# Altium footprint library B-NT_CONNECT.PcbLib: 109 footprints (part 4 of 7)
Each footprint in its own frame and in the unit in brackets; x right, y up, seen from the top. Pads: shape width x height; smd on the part's side, far side on the other; paste and mask are expansions set on the pad; w line width, h text height; cw(c..) or ccw(c..) is an arc to the next point about the centre after c.
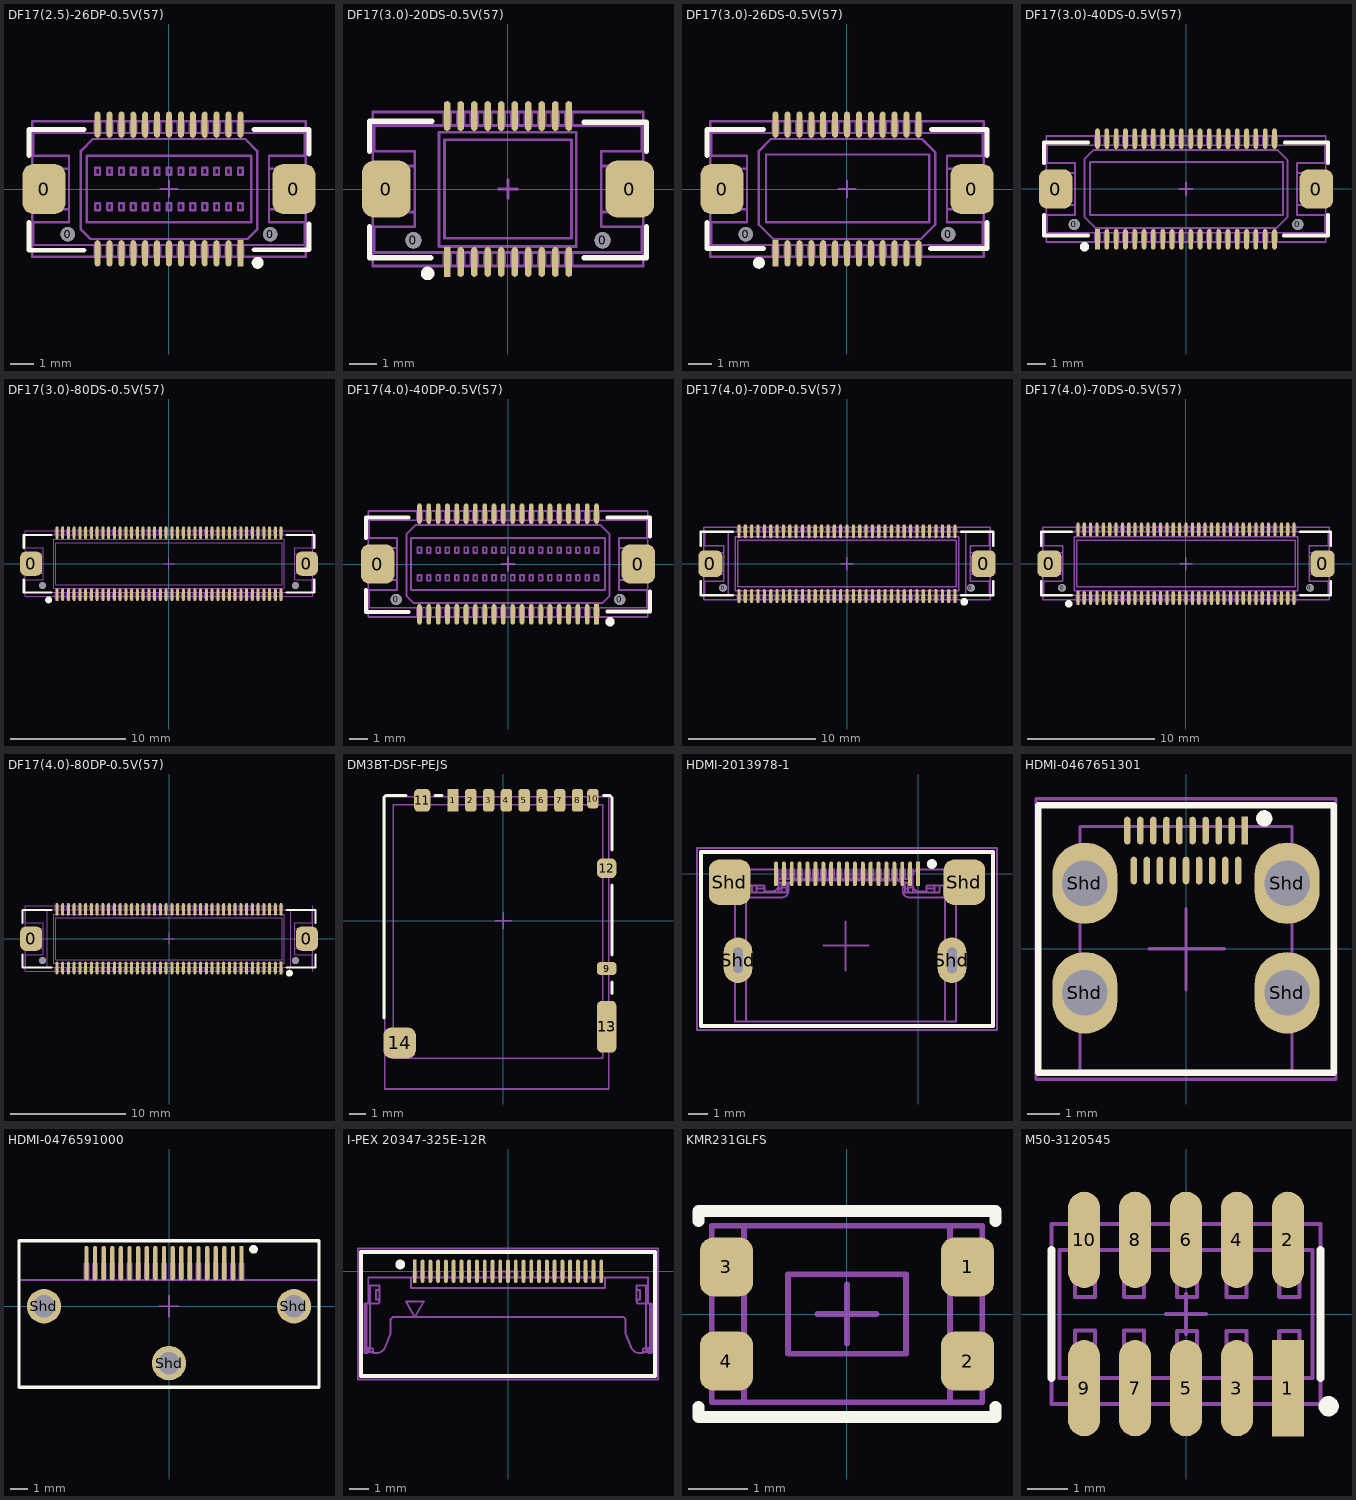
[diagram p3: the footprints below, top view; thin cyan lines are the x and y axes]

## DF17(2.5)-26DP-0.5V(57) [mm] "CONN HDR 26POS .5MM SMD W/FIT"
height 4.8
pads (30):
  rrect50% 1.8x2.1 smd: 0(-5.25,0) 0(5.25,0)
  round 0.6 hole 0.6: 0(-4.25,-1.9) 0(4.25,-1.9)
  rect 0.25x1.1 smd: 1(3,-2.7)
  oval 0.25x1.1 smd: 2(3,2.7) 3(2.5,-2.7) 4(2.5,2.7) 5(2,-2.7) 6(2,2.7) 7(1.5,-2.7) 8(1.5,2.7) 9(1,-2.7) 10(1,2.7) 11(0.5,-2.7) 12(0.5,2.7) 13(0,-2.7) 14(0,2.7) 15(-0.5,-2.7) 16(-0.5,2.7) 17(-1,-2.7) 18(-1,2.7) 19(-1.5,-2.7) 20(-1.5,2.7) 21(-2,-2.7) 22(-2,2.7) 23(-2.5,-2.7) 24(-2.5,2.7) 25(-3,-2.7) 26(-3,2.7)
Top Overlay:
  circle w0.3: c3.725,-3.1 r0.1
  lines w0.2: -5.875,-1.4 -5.875,-2.575 -3.575,-2.575 ; -5.875,1.4 -5.875,2.5 -3.575,2.5 ; 3.575,-2.55 5.875,-2.55 5.875,-1.475 ; 3.575,2.5 5.875,2.5 5.875,1.475
M3 Top Assy:
  drawing of 217 lines, arcs and shapes, not listed
M8 Top Brd Anno:
  lines w0.1: -0.35,0 0.35,0 ; 0,-0.325 0,0.35 ; -5.75,-2.85 -5.75,2.85 5.75,2.85 5.75,-2.85 -5.75,-2.85
3D body "DF17(2_5)-26DP-0_5V.stp": height 4.74, standoff -0.66, extent -5.75,-2.85 5.75,2.85

## DF17(3.0)-20DS-0.5V(57) [mm] "CONN RECEPT 20POS .5MM SMD W/FIT"
height 3.5
pads (24):
  rrect50% 1.8x2.1 smd: 0(-4.5,0) 0(4.5,0)
  round 0.6 hole 0.6: 0(-3.5,-1.9) 0(3.5,-1.9)
  rect 0.25x1.1 smd: 1(-2.25,-2.7)
  oval 0.25x1.1 smd: 2(-2.25,2.7) 3(-1.75,-2.7) 4(-1.75,2.7) 5(-1.25,-2.7) 6(-1.25,2.7) 7(-0.75,-2.7) 8(-0.75,2.7) 9(-0.25,-2.7) 10(-0.25,2.7) 11(0.25,-2.7) 12(0.25,2.7) 13(0.75,-2.7) 14(0.75,2.7) 15(1.25,-2.7) 16(1.25,2.7) 17(1.75,-2.7) 18(1.75,2.7) 19(2.25,-2.7) 20(2.25,2.7)
Top Overlay:
  circle w0.3: c-2.975,-3.125 r0.1
  lines w0.2: -5.125,-1.4 -5.125,-2.55 -2.85,-2.55 ; -5.125,1.4 -5.125,2.5 -2.825,2.5 ; 2.825,-2.55 5.125,-2.55 5.125,-1.4 ; 2.825,2.475 5.125,2.475 5.125,1.4
M3 Top Assy:
  lines w0.1: -3.45,-0.85 -4.95,-0.85 -4.95,0.85 -3.45,0.85 -3.45,0 ; -2.375,-2.35 -2.375,-2.85 -2.125,-2.85 -2.125,-2.35 ; -2.375,2.35 -2.375,2.85 -2.125,2.85 -2.125,2.35 ; -1.875,-2.35 -1.875,-2.85 -1.625,-2.85 -1.625,-2.35 ; -1.875,2.35 -1.875,2.85 -1.625,2.85 -1.625,2.35 ; -1.375,-2.35 -1.375,-2.85 -1.125,-2.85 -1.125,-2.35 ; -1.375,2.35 -1.375,2.85 -1.125,2.85 -1.125,2.35 ; -0.875,-2.35 -0.875,-2.85 -0.625,-2.85 -0.625,-2.35 ; -0.875,2.35 -0.875,2.85 -0.625,2.85 -0.625,2.35 ; -0.375,-2.35 -0.375,-2.85 -0.125,-2.85 -0.125,-2.35 ; -0.35,2.35 -0.35,2.85 -0.125,2.85 -0.125,2.35 ; 0.125,-2.35 0.125,-2.85 0.375,-2.85 0.375,-2.35 ; 0.125,2.35 0.125,2.85 0.375,2.85 0.375,2.35 ; 0.625,-2.35 0.625,-2.85 0.875,-2.85 0.875,-2.35 ; 0.625,2.35 0.625,2.85 0.875,2.85 0.875,2.35 ; 1.125,-2.35 1.125,-2.85 1.375,-2.85 1.375,-2.35 ; 1.125,2.35 1.125,2.85 1.375,2.85 1.375,2.35 ; 1.625,-2.35 1.625,-2.85 1.875,-2.85 1.875,-2.35 ; 1.625,2.35 1.625,2.85 1.875,2.85 1.875,2.35 ; 2.125,-2.35 2.125,-2.85 2.375,-2.85 2.375,-2.35 ; 2.125,2.35 2.125,2.85 ; 2.375,2.35 2.375,2.85 ; 3.45,-0.85 4.95,-0.85 4.95,0.85 3.45,0.85 ; -3.45,0 -3.45,1.4 -4.95,1.4 -4.95,2.35 4.95,2.35 ; -3.45,0 -3.45,-1.4 -4.95,-1.4 -4.95,-2.35 4.95,-2.35 4.95,-1.4 3.45,-1.4 3.45,0 3.45,1.4 4.95,1.4 4.95,2.35 ; 2.125,2.85 2.375,2.85 ; 2.125,2.85 2.375,2.85 ; 4.95,2.35 4.95,2.35 ; -2.55,-2.125 -2.55,2.1 2.525,2.1 2.525,-2.125 -2.55,-2.125 ; -2.35,-1.825 2.35,-1.825 2.35,1.825 -2.35,1.825 -2.35,-1.825
M8 Top Brd Anno:
  lines w0.1: -0.35,0 0.35,0 ; 0,-0.35 0,0.35 ; -5,-2.85 5,-2.85 5,2.85 -5,2.85 -5,-2.85
3D body "DF17(3_0)-20DS-0_5V.stp": height 3.5, standoff -0.6, extent -5,-2.85 5,2.85

## DF17(3.0)-26DS-0.5V(57) [mm] "CONN RECEPT 26POS .5MM SMD W/FIT"
height 3.5
pads (30):
  rrect50% 1.8x2.1 smd: 0(-5.25,0) 0(5.25,0)
  round 0.6 hole 0.6: 0(-4.25,-1.9) 0(4.25,-1.9)
  rect 0.25x1.1 smd: 1(-3,-2.7)
  oval 0.25x1.1 smd: 2(-3,2.7) 3(-2.5,-2.7) 4(-2.5,2.7) 5(-2,-2.7) 6(-2,2.7) 7(-1.5,-2.7) 8(-1.5,2.7) 9(-1,-2.7) 10(-1,2.7) 11(-0.5,-2.7) 12(-0.5,2.7) 13(0,-2.7) 14(0,2.7) 15(0.5,-2.7) 16(0.5,2.7) 17(1,-2.7) 18(1,2.7) 19(1.5,-2.7) 20(1.5,2.7) 21(2,-2.7) 22(2,2.7) 23(2.5,-2.7) 24(2.5,2.7) 25(3,-2.7) 26(3,2.7)
Top Overlay:
  circle w0.3: c-3.7,-3.1 r0.1
  lines w0.2: -5.875,-1.4 -5.875,-2.5 -3.5,-2.5 ; -5.875,1.4 -5.875,2.5 -3.5,2.5 ; 3.5,-2.5 5.875,-2.5 5.875,-1.4 ; 3.55,2.5 5.875,2.5 5.875,1.4
M3 Top Assy:
  lines w0.1: -4.2,-0.85 -5.7,-0.85 -5.7,0.85 -4.2,0.85 -4.2,0 ; -3.125,-2.35 -3.125,-2.85 -2.875,-2.85 -2.875,-2.35 ; -3.125,2.35 -3.125,2.85 -2.875,2.85 -2.875,2.35 ; -2.625,-2.35 -2.625,-2.85 -2.375,-2.85 -2.375,-2.35 ; -2.625,2.35 -2.625,2.85 -2.375,2.85 -2.375,2.35 ; -2.125,-2.35 -2.125,-2.85 -1.875,-2.85 -1.875,-2.35 ; -2.125,2.35 -2.125,2.85 -1.875,2.85 -1.875,2.35 ; -1.625,-2.35 -1.625,-2.85 -1.375,-2.85 -1.375,-2.35 ; -1.625,2.35 -1.625,2.85 -1.375,2.85 -1.375,2.35 ; -1.125,-2.35 -1.125,-2.85 -0.875,-2.85 -0.875,-2.35 ; -1.1,2.35 -1.1,2.85 -0.875,2.85 -0.875,2.35 ; -0.625,-2.35 -0.625,-2.85 -0.375,-2.85 -0.375,-2.35 ; -0.625,2.35 -0.625,2.85 -0.375,2.85 -0.375,2.35 ; -0.125,-2.35 -0.125,-2.85 0.125,-2.85 0.125,-2.35 ; -0.125,2.35 -0.125,2.85 0.125,2.85 0.125,2.35 ; 0.375,-2.35 0.375,-2.85 0.625,-2.85 0.625,-2.35 ; 0.375,2.35 0.375,2.85 0.625,2.85 0.625,2.35 ; 0.875,-2.35 0.875,-2.85 1.125,-2.85 1.125,-2.35 ; 0.875,2.35 0.875,2.85 1.125,2.85 1.125,2.35 ; 1.375,-2.35 1.375,-2.85 1.625,-2.85 1.625,-2.35 ; 1.375,2.35 1.375,2.85 ; 1.625,2.35 1.625,2.85 ; 1.875,-2.35 1.875,-2.85 2.125,-2.85 2.125,-2.35 ; 1.875,2.375 1.875,2.875 2.125,2.875 2.125,2.375 ; 2.375,-2.35 2.375,-2.85 2.625,-2.85 2.625,-2.35 ; 2.375,2.35 2.375,2.85 2.625,2.85 2.625,2.35 ; 2.875,-2.35 2.875,-2.85 3.125,-2.85 3.125,-2.35 ; 2.875,2.35 2.875,2.85 3.125,2.85 3.125,2.35 ; 4.2,-0.85 5.7,-0.85 5.7,0.85 4.2,0.85 ; -4.2,0 -4.2,-1.4 -5.7,-1.4 -5.7,-2.35 5.7,-2.35 5.7,-1.4 4.2,-1.4 4.2,0 4.2,1.4 5.7,1.4 5.7,2.35 -5.7,2.35 -5.7,1.4 -4.2,1.4 -4.2,0 ; 1.375,2.85 1.625,2.85 ; 1.375,2.85 1.625,2.85 ; -3.7,-1.5 -3.7,1.6 -3.2,2.1 3.15,2.1 3.7,1.55 3.7,-1.5 3.1,-2.1 -3.1,-2.1 -3.7,-1.5 ; -3.4,-1.4 -3.4,0.913 -3.4,1.45 3.45,1.45 3.45,-1.4 -3.4,-1.4
M8 Top Brd Anno:
  lines w0.1: -0.35,0 0.35,0 ; 0,-0.35 0,0.35 ; -5.75,-2.85 5.75,-2.85 5.75,2.85 -5.75,2.85 -5.75,-2.85
3D body "DF17(3_0)-26DS-0_5V.stp": height 3.42, standoff -0.68, extent -5.75,-2.85 5.75,2.85

## DF17(3.0)-40DS-0.5V(57) [mm]
pads (44):
  rrect50% 1.8x2.1 smd: 0(-7,0) 0(7,0)
  round 0.6 hole 0.6: 0(-6,-1.9) 0(6,-1.9)
  rect 0.25x1.1 smd: 1(-4.75,-2.7)
  oval 0.25x1.1 smd: 2(-4.75,2.7) 3(-4.25,-2.7) 4(-4.25,2.7) 5(-3.75,-2.7) 6(-3.75,2.7) 7(-3.25,-2.7) 8(-3.25,2.7) 9(-2.75,-2.7) 10(-2.75,2.7) 11(-2.25,-2.7) 12(-2.25,2.7) 13(-1.75,-2.7) 14(-1.75,2.7) 15(-1.25,-2.7) 16(-1.25,2.7) 17(-0.75,-2.7) 18(-0.75,2.7) 19(-0.25,-2.7) 20(-0.25,2.7) 21(0.25,-2.7) 22(0.25,2.7) 23(0.75,-2.7) 24(0.75,2.7) 25(1.25,-2.7) 26(1.25,2.7) 27(1.75,-2.7) 28(1.75,2.7) 29(2.25,-2.7) 30(2.25,2.7) 31(2.75,-2.7) 32(2.75,2.7) 33(3.25,-2.7) 34(3.25,2.7) 35(3.75,-2.7) 36(3.75,2.7) 37(4.25,-2.7) 38(4.25,2.7) 39(4.75,-2.7) 40(4.75,2.7)
Top Overlay:
  circle w0.3: c-5.45,-3.1 r0.1
  lines w0.2: -7.625,-1.4 -7.625,-2.5 -5.25,-2.5 ; -7.625,1.4 -7.625,2.5 -5.25,2.5 ; 5.25,-2.5 7.625,-2.5 7.625,-1.4 ; 5.3,2.5 7.625,2.5 7.625,1.4
M3 Top Assy:
  drawing of 157 lines, arcs and shapes, not listed
M8 Top Brd Anno:
  lines w0.1: -0.35,0 0.35,0 ; 0,-0.35 0,0.35 ; -7.5,-2.85 7.5,-2.85 7.5,2.85 -7.5,2.85 -7.5,-2.85
3D body "DF17(3_0)-40DS-0_5V.stp": height 3.42, standoff -0.68, extent -7.5,-2.85 7.5,2.85

## DF17(3.0)-80DS-0.5V(57) [mm]
pads (84):
  rrect50% 1.9x2.1 smd: 0(-12,0) 0(12,0)
  round 0.6 hole 0.6: 0(-11,-1.9) 0(11,-1.9)
  rect 0.25x1.1 smd: 1(-9.75,-2.7)
  oval 0.25x1.1 smd: 2(-9.75,2.7) 3(-9.25,-2.7) 4(-9.25,2.7) 5(-8.75,-2.7) 6(-8.75,2.7) 7(-8.25,-2.7) 8(-8.25,2.7) 9(-7.75,-2.7) 10(-7.75,2.7) 11(-7.25,-2.7) 12(-7.25,2.7) 13(-6.75,-2.7) 14(-6.75,2.7) 15(-6.25,-2.7) 16(-6.25,2.7) 17(-5.75,-2.7) 18(-5.75,2.7) 19(-5.25,-2.7) 20(-5.25,2.7) 21(-4.75,-2.7) 22(-4.75,2.7) 23(-4.25,-2.7) 24(-4.25,2.7) 25(-3.75,-2.7) 26(-3.75,2.7) 27(-3.25,-2.7) 28(-3.25,2.7) 29(-2.75,-2.7) 30(-2.75,2.7) 31(-2.25,-2.7) 32(-2.25,2.7) 33(-1.75,-2.7) 34(-1.75,2.7) 35(-1.25,-2.7) 36(-1.25,2.7) 37(-0.75,-2.7) 38(-0.75,2.7) 39(-0.25,-2.7) 40(-0.25,2.7) 41(0.25,-2.7) 42(0.25,2.7) 43(0.75,-2.7) 44(0.75,2.7) 45(1.25,-2.7) 46(1.25,2.7) 47(1.75,-2.7) 48(1.75,2.7) 49(2.25,-2.7) 50(2.25,2.7) 51(2.75,-2.7) 52(2.75,2.7) 53(3.25,-2.7) 54(3.25,2.7) 55(3.75,-2.7) 56(3.75,2.7) 57(4.25,-2.7) 58(4.25,2.7) 59(4.75,-2.7) 60(4.75,2.7) 61(5.25,-2.7) 62(5.25,2.7) 63(5.75,-2.7) 64(5.75,2.7) 65(6.25,-2.7) 66(6.25,2.7) 67(6.75,-2.7) 68(6.75,2.7) 69(7.25,-2.7) 70(7.25,2.7) 71(7.75,-2.7) 72(7.75,2.7) 73(8.25,-2.7) 74(8.25,2.7) 75(8.75,-2.7) 76(8.75,2.7) 77(9.25,-2.7) 78(9.25,2.7) 79(9.75,-2.7) 80(9.75,2.7)
Top Overlay:
  circle w0.3: c-10.475,-3.15 r0.15
  lines w0.2: -12.625,-1.4 -12.625,-2.5 -10.25,-2.5 ; -12.625,1.4 -12.625,2.5 -10.25,2.5 ; 10.25,-2.5 12.625,-2.5 12.625,-1.4 ; 10.25,2.5 12.625,2.5 12.625,1.4
M3 Top Assy:
  drawing of 269 lines, arcs and shapes, not listed
M8 Top Brd Anno:
  lines w0.1: -0.5,0 0.5,0 ; 0,-0.5 0,0.5 ; -12.5,-2.85 12.5,-2.85 12.5,2.85 -12.5,2.85 -12.5,-2.85
3D body "DF17(3_0)-80DS-0_5V.stp": height 3.5, standoff -0.6, extent -12.5,-2.85 12.5,2.85

## DF17(4.0)-40DP-0.5V(57) [mm]
pads (44):
  rrect50% 1.8x2.1 smd: 0(-7,0) 0(7,0)
  round 0.6 hole 0.6: 0(-6,-1.9) 0(6,-1.9)
  rect 0.25x1.1 smd: 1(4.75,-2.7)
  oval 0.25x1.1 smd: 2(4.75,2.7) 3(4.25,-2.7) 4(4.25,2.7) 5(3.75,-2.7) 6(3.75,2.7) 7(3.25,-2.7) 8(3.25,2.7) 9(2.75,-2.7) 10(2.75,2.7) 11(2.25,-2.7) 12(2.25,2.7) 13(1.75,-2.7) 14(1.75,2.7) 15(1.25,-2.7) 16(1.25,2.7) 17(0.75,-2.7) 18(0.75,2.7) 19(0.25,-2.7) 20(0.25,2.7) 21(-0.25,-2.7) 22(-0.25,2.7) 23(-0.75,-2.7) 24(-0.75,2.7) 25(-1.25,-2.7) 26(-1.25,2.7) 27(-1.75,-2.7) 28(-1.75,2.7) 29(-2.25,-2.7) 30(-2.25,2.7) 31(-2.75,-2.7) 32(-2.75,2.7) 33(-3.25,-2.7) 34(-3.25,2.7) 35(-3.75,-2.7) 36(-3.75,2.7) 37(-4.25,-2.7) 38(-4.25,2.7) 39(-4.75,-2.7) 40(-4.75,2.7)
Top Overlay:
  circle w0.3: c5.475,-3.1 r0.1
  lines w0.2: -7.625,-1.4 -7.625,-2.575 -5.325,-2.575 ; -7.625,1.4 -7.625,2.5 -5.325,2.5 ; 5.325,-2.55 7.625,-2.55 7.625,-1.475 ; 5.325,2.5 7.625,2.5 7.625,1.475
M3 Top Assy:
  drawing of 316 lines, arcs and shapes, not listed
M8 Top Brd Anno:
  lines w0.1: -0.35,0 0.35,0 ; 0,-0.35 0,0.35 ; -7.5,-2.85 7.5,-2.85 7.5,2.85 -7.5,2.85 -7.5,-2.85
3D body "DF17(4_0)-40DP-0_5V.stp": height 6.24, standoff -0.66, extent -7.5,-2.85 7.5,2.85

## DF17(4.0)-70DP-0.5V(57) [mm]
pads (74):
  rrect50% 1.9x2.1 smd: 0(-10.75,0) 0(10.75,0)
  round 0.6 hole 0.6: 0(-9.75,-1.9) 0(9.75,-1.9)
  rect 0.25x1.1 smd: 1(8.5,-2.55)
  oval 0.25x1.1 smd: 2(8.5,2.55) 3(8,-2.55) 4(8,2.55) 5(7.5,-2.55) 6(7.5,2.55) 7(7,-2.55) 8(7,2.55) 9(6.5,-2.55) 10(6.5,2.55) 11(6,-2.55) 12(6,2.55) 13(5.5,-2.55) 14(5.5,2.55) 15(5,-2.55) 16(5,2.55) 17(4.5,-2.55) 18(4.5,2.55) 19(4,-2.55) 20(4,2.55) 21(3.5,-2.55) 22(3.5,2.55) 23(3,-2.55) 24(3,2.55) 25(2.5,-2.55) 26(2.5,2.55) 27(2,-2.55) 28(2,2.55) 29(1.5,-2.55) 30(1.5,2.55) 31(1,-2.55) 32(1,2.55) 33(0.5,-2.55) 34(0.5,2.55) 35(0,-2.55) 36(0,2.55) 37(-0.5,-2.55) 38(-0.5,2.55) 39(-1,-2.55) 40(-1,2.55) 41(-1.5,-2.55) 42(-1.5,2.55) 43(-2,-2.55) 44(-2,2.55) 45(-2.5,-2.55) 46(-2.5,2.55) 47(-3,-2.55) 48(-3,2.55) 49(-3.5,-2.55) 50(-3.5,2.55) 51(-4,-2.55) 52(-4,2.55) 53(-4.5,-2.55) 54(-4.5,2.55) 55(-5,-2.55) 56(-5,2.55) 57(-5.5,-2.55) 58(-5.5,2.55) 59(-6,-2.55) 60(-6,2.55) 61(-6.5,-2.55) 62(-6.5,2.55) 63(-7,-2.55) 64(-7,2.55) 65(-7.5,-2.55) 66(-7.5,2.55) 67(-8,-2.55) 68(-8,2.55) 69(-8.5,-2.55) 70(-8.5,2.55)
Top Overlay:
  circle w0.3: c9.225,-3 r0.15
  lines w0.2: -11.5,-1.4 -11.5,-2.5 -9,-2.5 ; -11.5,1.4 -11.5,2.5 -9,2.5 ; 9,-2.5 11.5,-2.5 11.5,-1.4 ; 9,2.5 11.5,2.5 11.5,1.4
M3 Top Assy:
  drawing of 241 lines, arcs and shapes, not listed
M8 Top Brd Anno:
  lines w0.1: -0.5,0 0.5,0 ; 0,-0.5 0,0.5 ; -11.25,-2.85 -11.25,2.85 11.25,2.85 11.25,-2.85 -11.25,-2.85
3D body "DF17(4_0)-70DP-0_5V.stp": height 6.29, standoff -0.61, extent -11.25,-2.85 11.25,2.85

## DF17(4.0)-70DS-0.5V(57) [mm]
pads (74):
  rrect50% 1.9x2.1 smd: 0(-10.75,0) 0(10.75,0)
  round 0.6 hole 0.6: 0(-9.75,-1.9) 0(9.75,-1.9)
  rect 0.25x1.1 smd: 1(-8.5,-2.7)
  oval 0.25x1.1 smd: 2(-8.5,2.7) 3(-8,-2.7) 4(-8,2.7) 5(-7.5,-2.7) 6(-7.5,2.7) 7(-7,-2.7) 8(-7,2.7) 9(-6.5,-2.7) 10(-6.5,2.7) 11(-6,-2.7) 12(-6,2.7) 13(-5.5,-2.7) 14(-5.5,2.7) 15(-5,-2.7) 16(-5,2.7) 17(-4.5,-2.7) 18(-4.5,2.7) 19(-4,-2.7) 20(-4,2.7) 21(-3.5,-2.7) 22(-3.5,2.7) 23(-3,-2.7) 24(-3,2.7) 25(-2.5,-2.7) 26(-2.5,2.7) 27(-2,-2.7) 28(-2,2.7) 29(-1.5,-2.7) 30(-1.5,2.7) 31(-1,-2.7) 32(-1,2.7) 33(-0.5,-2.7) 34(-0.5,2.7) 35(0,-2.7) 36(0,2.7) 37(0.5,-2.7) 38(0.5,2.7) 39(1,-2.7) 40(1,2.7) 41(1.5,-2.7) 42(1.5,2.7) 43(2,-2.7) 44(2,2.7) 45(2.5,-2.7) 46(2.5,2.7) 47(3,-2.7) 48(3,2.7) 49(3.5,-2.7) 50(3.5,2.7) 51(4,-2.7) 52(4,2.7) 53(4.5,-2.7) 54(4.5,2.7) 55(5,-2.7) 56(5,2.7) 57(5.5,-2.7) 58(5.5,2.7) 59(6,-2.7) 60(6,2.7) 61(6.5,-2.7) 62(6.5,2.7) 63(7,-2.7) 64(7,2.7) 65(7.5,-2.7) 66(7.5,2.7) 67(8,-2.7) 68(8,2.7) 69(8.5,-2.7) 70(8.5,2.7)
Top Overlay:
  circle w0.3: c-9.225,-3.15 r0.15
  lines w0.2: -11.375,-1.4 -11.375,-2.5 -9,-2.5 ; -11.375,1.4 -11.375,2.5 -9,2.5 ; 9,-2.5 11.375,-2.5 11.375,-1.4 ; 9,2.5 11.375,2.5 11.375,1.4
M3 Top Assy:
  drawing of 239 lines, arcs and shapes, not listed
M8 Top Brd Anno:
  lines w0.1: -0.5,0 0.5,0 ; 0,-0.5 0,0.5 ; -11.25,-2.85 11.25,-2.85 11.25,2.85 -11.25,2.85 -11.25,-2.85
3D body "DF17(4_0)-70DS-0_5V.stp": height 4.5, standoff -0.6, extent -11.25,-2.85 11.25,2.85

## DF17(4.0)-80DP-0.5V(57) [mm]
pads (84):
  rrect50% 1.9x2.1 smd: 0(-12,0) 0(12,0)
  round 0.6 hole 0.6: 0(-11,-1.9) 0(11,-1.9)
  rect 0.25x1.1 smd: 1(9.75,-2.55)
  oval 0.25x1.1 smd: 2(9.75,2.55) 3(9.25,-2.55) 4(9.25,2.55) 5(8.75,-2.55) 6(8.75,2.55) 7(8.25,-2.55) 8(8.25,2.55) 9(7.75,-2.55) 10(7.75,2.55) 11(7.25,-2.55) 12(7.25,2.55) 13(6.75,-2.55) 14(6.75,2.55) 15(6.25,-2.55) 16(6.25,2.55) 17(5.75,-2.55) 18(5.75,2.55) 19(5.25,-2.55) 20(5.25,2.55) 21(4.75,-2.55) 22(4.75,2.55) 23(4.25,-2.55) 24(4.25,2.55) 25(3.75,-2.55) 26(3.75,2.55) 27(3.25,-2.55) 28(3.25,2.55) 29(2.75,-2.55) 30(2.75,2.55) 31(2.25,-2.55) 32(2.25,2.55) 33(1.75,-2.55) 34(1.75,2.55) 35(1.25,-2.55) 36(1.25,2.55) 37(0.75,-2.55) 38(0.75,2.55) 39(0.25,-2.55) 40(0.25,2.55) 41(-0.25,-2.55) 42(-0.25,2.55) 43(-0.75,-2.55) 44(-0.75,2.55) 45(-1.25,-2.55) 46(-1.25,2.55) 47(-1.75,-2.55) 48(-1.75,2.55) 49(-2.25,-2.55) 50(-2.25,2.55) 51(-2.75,-2.55) 52(-2.75,2.55) 53(-3.25,-2.55) 54(-3.25,2.55) 55(-3.75,-2.55) 56(-3.75,2.55) 57(-4.25,-2.55) 58(-4.25,2.55) 59(-4.75,-2.55) 60(-4.75,2.55) 61(-5.25,-2.55) 62(-5.25,2.55) 63(-5.75,-2.55) 64(-5.75,2.55) 65(-6.25,-2.55) 66(-6.25,2.55) 67(-6.75,-2.55) 68(-6.75,2.55) 69(-7.25,-2.55) 70(-7.25,2.55) 71(-7.75,-2.55) 72(-7.75,2.55) 73(-8.25,-2.55) 74(-8.25,2.55) 75(-8.75,-2.55) 76(-8.75,2.55) 77(-9.25,-2.55) 78(-9.25,2.55) 79(-9.75,-2.55) 80(-9.75,2.55)
Top Overlay:
  circle w0.3: c10.475,-3 r0.15
  lines w0.2: -12.75,-1.4 -12.75,-2.5 -10.25,-2.5 ; -12.75,1.4 -12.75,2.5 -10.25,2.5 ; 10.25,-2.5 12.75,-2.5 12.75,-1.4 ; 10.25,2.5 12.75,2.5 12.75,1.4
M3 Top Assy:
  drawing of 271 lines, arcs and shapes, not listed
M8 Top Brd Anno:
  lines w0.1: -0.5,0 0.5,0 ; 0,-0.5 0,0.5 ; 10,-2.85 -12.5,-2.85 -12.5,2.85 10,2.85 ; 12.5,-2.85 12.5,2.85
3D body "DF17(4_0)-80DP-0_5V.stp": height 6.29, standoff -0.61, extent -12.5,-2.85 12.5,2.85

## DM3BT-DSF-PEJS [mm] "microSD"
pads (14):
  rect 0.7x1.4 smd: 1(-3.1,7.45)
  rrect50% 0.7x1.4 smd: 2(-2,7.45) 3(-0.9,7.45) 4(0.2,7.45) 5(1.3,7.45) 6(2.4,7.45) 7(3.5,7.45) 8(4.6,7.45)
  rrect50% 1.2x0.8 smd: 9(6.4,-2.95)
  rrect50% 0.7x1.2 smd: 10(5.55,7.55)
  rrect50% 1x1.4 smd: 11(-5,7.45)
  rrect50% 1.2x1.2 smd: 12(6.4,3.25)
  rrect50% 1.2x3.2 smd: 13(6.4,-6.55)
  rrect50% 2x1.9 smd: 14(-6.4,-7.55)
Top Overlay:
  lines w0.2: -7.375,-6 -7.375,7.625 -7.25,7.75 -6,7.75 ; -4.2,7.75 -3.8,7.75 ; 6.2,7.75 6.6,7.75 6.725,7.625 6.725,4.375 ; 6.725,-4.5 6.725,-3.8 ; 6.725,-2.1 6.725,2.2 ; -6,7.75 -6,7.75
M3 Top Assy:
  lines w0.1: -6.8,-8.2 -7.225,-8.2 -7.225,-6.9 -6.8,-6.9 ; -5.4,7.175 -5.4,7.625 -4.6,7.625 -4.6,7.175 -5,7.175 ; -3.375,7.175 -3.375,7.625 -2.825,7.625 -2.825,7.175 -3.1,7.175 ; -2.275,7.175 -2.275,7.625 -1.725,7.625 -1.725,7.175 ; -1.175,7.175 -1.175,7.625 -0.625,7.625 -0.625,7.175 ; -0.075,7.175 -0.075,7.625 0.475,7.625 0.475,7.175 ; 1.025,7.175 1.025,7.625 1.575,7.625 1.575,7.175 ; 2.125,7.175 2.125,7.625 2.675,7.625 2.675,7.175 ; 3.225,7.175 3.225,7.625 3.775,7.625 3.775,7.175 ; 4.325,7.175 4.325,7.625 4.875,7.625 4.875,7.175 ; 5.275,7.175 5.275,7.625 5.825,7.625 5.825,7.175 ; 6.15,-7.875 6.575,-7.875 6.575,-5.225 6.15,-5.225 ; 6.15,-3.175 6.575,-3.175 6.575,-2.725 6.15,-2.725 ; 6.15,2.85 6.575,2.85 6.575,3.65 6.15,3.65 ; -6.8,-8.5 -6.8,7.175 6.15,7.175 6.15,-8.5 -6.8,-8.5
M8 Top Brd Anno:
  lines w0.1: -0.5,0 0.5,0 ; 0,-0.5 0,0.5 ; -7.325,-10.4 6.525,-10.4 6.525,7.675 -7.325,7.675 -7.325,-10.4
3D body "DM3BT+.sldprt.STEP": height 1.95, standoff 0.12, extent -7.325,-10.406 6.525,7.675

## HDMI-2013978-1 [mm] "CONN RECPT PCB 19POS"
height 3.45
pads (23):
  rect 0.2x1.25 smd: 1(0,0)
  oval 0.2x1.25 smd: 2(-0.4,0) 3(-0.8,0) 4(-1.2,0) 5(-1.6,0) 6(-2,0) 7(-2.4,0) 8(-2.8,0) 9(-3.2,0) 10(-3.6,0) 11(-4,0) 12(-4.4,0) 13(-4.8,0) 14(-5.2,0) 15(-5.6,0) 16(-6,0) 17(-6.4,0) 18(-6.8,0) 19(-7.2,0)
  rrect50% 2.1x2.3 smd: Shd(-9.55,-0.425) Shd(2.35,-0.425)
  oval 1.45x2.3 hole 0.5 slot 1.3 at 90 deg: Shd(-9.12,-4.375) Shd(1.72,-4.375)
Top Overlay:
  circle w0.3: c0.7,0.5 r0.1
  lines w0.2: -11,-7.7 3.8,-7.7 3.8,1.1 -11,1.1 -11,-7.7
M3 Top Assy:
  lines w0.1: -9.525,-1.088 -9.525,0.212 ; -9.275,-1.088 -10.125,-1.088 -10.125,0.212 -9.275,0.212 ; -8.725,-7.488 -8.725,-1.188 ; -8.675,-1.188 -8.675,-0.588 ; -8.425,-0.588 -8.425,-0.938 -6.582,-0.938 ; -8.175,-0.938 -8.175,-0.588 ; -8.175,-0.738 -7.775,-0.738 ; -7.313,-0.938 -7.313,-0.879 ; -7.313,0.212 -7.068,0.212 -7.068,-0.258 ; -7.094,-0.688 -7.068,-0.688 ; -7.075,-0.418 -7.068,-0.418 -7.068,-0.938 ; -7.075,-0.258 -0.275,-0.258 ; -7.068,-0.738 -6.913,-0.738 ; -7.068,-0.458 -6.913,-0.458 ; -6.913,-0.938 -6.913,-0.418 -6.668,-0.418 -6.668,-0.938 ; -6.913,-0.688 -6.668,-0.688 ; -6.913,-0.258 -6.913,0.212 -6.668,0.212 -6.668,-0.258 ; -6.668,-0.738 -6.575,-0.738 ; -6.668,-0.458 -6.513,-0.458 ; -6.513,-0.458 -6.513,-0.418 -6.477,-0.418 ; -6.513,-0.258 -6.513,0.212 -6.268,0.212 -6.268,-0.258 ; -6.113,-0.258 -6.113,0.212 -5.868,0.212 -5.868,-0.258 ; -5.713,-0.258 -5.713,0.212 -5.468,0.212 -5.468,-0.258 ; -5.313,-0.258 -5.313,0.212 -5.068,0.212 -5.068,-0.258 ; -4.913,-0.258 -4.913,0.212 -4.668,0.212 -4.668,-0.258 ; -4.513,-0.258 -4.513,0.212 -4.268,0.212 -4.268,-0.258 ; -4.113,-0.258 -4.113,0.212 -3.868,0.212 -3.868,-0.258 ; -3.713,-0.258 -3.713,0.212 -3.468,0.212 -3.468,-0.258 ; -3.313,-0.258 -3.313,0.212 -3.068,0.212 -3.068,-0.258 ; -2.913,-0.258 -2.913,0.212 -2.668,0.212 -2.668,-0.258 ; -2.513,-0.258 -2.513,0.212 -2.268,0.212 -2.268,-0.258 ; -2.113,-0.258 -2.113,0.212 -1.868,0.212 -1.868,-0.258 ; -1.713,-0.258 -1.713,0.212 -1.468,0.212 -1.468,-0.258 ; -1.313,-0.258 -1.313,0.212 -1.068,0.212 -1.068,-0.258 ; -0.913,-0.258 -0.913,0.212 -0.668,0.212 -0.668,-0.258 ; -0.873,-0.418 -0.668,-0.418 -0.668,-0.938 ; -0.775,-0.688 -0.668,-0.688 ; -0.768,-0.938 1.075,-0.938 1.075,-0.588 ; -0.668,-0.738 -0.513,-0.738 ; -0.668,-0.458 -0.513,-0.458 ; -0.513,-0.938 -0.513,-0.418 -0.275,-0.418 ; -0.513,-0.688 -0.268,-0.688 ; -0.513,-0.258 -0.513,0.212 -0.268,0.212 -0.268,-0.031 ; -0.268,-0.938 -0.268,-0.644 ; -0.268,-0.738 -0.235,-0.738 ; -0.113,-0.938 -0.113,-0.852 ; -0.113,0.177 -0.113,0.212 1.375,0.212 ; 0.025,0.212 ccw(c0.025,-0.088) -0.275,-0.088 -0.275,-0.588 ccw(c0.025,-0.588) 0.025,-0.888 0.425,-0.888 0.425,-0.638 cw(c0.475,-0.638) 0.475,-0.588 1.375,-0.588 ; 0.132,-0.938 0.132,-0.888 ; 0.425,-0.738 0.825,-0.738 ; 0.825,-0.938 0.825,-0.588 ; 1.325,-1.188 1.325,-0.588 ; 1.375,-7.488 1.375,-1.188 ; 1.925,-1.088 2.775,-1.088 2.775,0.212 1.925,0.212 ; 2.175,-1.088 2.175,0.212 ; -9.275,0.212 -9.275,-7.488 1.925,-7.488 1.925,0.212 ; -9.275,0.212 -8.725,0.212 ; -8.725,-1.188 cw(c-8.725,-1.038) -8.875,-1.038 -8.875,-0.738 cw(c-8.725,-0.738) -8.725,-0.588 ; -8.725,-1.188 -6.875,-1.188 ccw(c-6.875,-0.888) -6.575,-0.888 -6.575,-0.638 cw(c-6.275,-0.638) -6.275,-0.338 -1.075,-0.338 cw(c-1.075,-0.638) -0.775,-0.638 -0.775,-0.888 ccw(c-0.475,-0.888) -0.475,-1.188 1.375,-1.188 ; -8.725,-0.588 -8.725,0.212 ; -8.725,-0.588 -7.825,-0.588 cw(c-7.825,-0.638) -7.775,-0.638 -7.775,-0.888 -7.375,-0.888 ccw(c-7.375,-0.588) -7.075,-0.588 -7.075,-0.088 ccw(c-7.375,-0.088) -7.375,0.212 -8.725,0.212 ; 1.375,-1.188 ccw(c1.375,-1.038) 1.525,-1.038 1.525,-0.738 ccw(c1.375,-0.738) 1.375,-0.588 ; 1.375,-0.588 1.375,0.212 ; 1.375,0.212 1.925,0.212
M8 Top Brd Anno:
  lines w0.1: -4.8,-3.638 -2.5,-3.638 ; -3.675,-4.9 -3.675,-2.4 ; -11.2,-7.9 4,-7.9 4,1.3 -11.2,1.3 -11.2,-7.9
3D body "c-2013978-1-f-3d.stp": height 3.45, standoff -0.6, extent -10.15,-7.55 2.75,0.15
3D body: height 0.25, standoff 0, extent -1,4.112 -1,4.112

## HDMI-0467651301 [mm] "HDMI MICRO TH RCPT PCB 19POS"
height 2.9
pads (23):
  rect 0.2x0.85 smd: 1(1.8,3.625)
  oval 0.2x0.85 smd: 2(1.6,2.4) 3(1.4,3.625) 4(1.2,2.4) 5(1,3.625) 6(0.8,2.4) 7(0.6,3.625) 8(0.4,2.4) 9(0.2,3.625) 10(0,2.4) 11(-0.2,3.625) 12(-0.4,2.4) 13(-0.6,3.625) 14(-0.8,2.4) 15(-1,3.625) 16(-1.2,2.4) 17(-1.4,3.625) 18(-1.6,2.4) 19(-1.8,3.625)
  oval 2x2.5 hole 1.4: Shd(-3.1,-1.35) Shd(-3.1,2.01) Shd(3.1,-1.35) Shd(3.1,2.01)
Top Overlay:
  lines w0.2: -4.525,-3.8 4.525,-3.8 4.525,4.4 -4.525,4.4 -4.525,-3.8
  lines w0.3: 2.486,4.051 ccw(c2.4,4) 2.5,4
M3 Top Assy:
  lines w0.1: -3.25,-3.75 -3.25,3.75 3.25,3.75 3.25,-3.75 -3.25,-3.75
M8 Top Brd Anno:
  lines w0.1: -1.125,0 1.175,0 ; 0,-1.262 0,1.238 ; -4.6,-4 4.6,-4 4.6,4.6 -4.6,4.6 -4.6,-4
3D body: height 0.25, standoff 0, extent -1,4.112 -1,4.112
3D body "467651301.stp": height 2.92, standoff -0.6, extent -3.25,-3.75 3.25,3.75

## HDMI-0476591000 [mm] "HDMI REC.VERTICAL SMT TYPE"
height 8.5
pads (22):
  rect 0.25x2 smd: 1(4.21,2.5)
  oval 0.25x2 smd: 2(3.71,2.5) 3(3.21,2.5) 4(2.71,2.5) 5(2.21,2.5) 6(1.71,2.5) 7(1.21,2.5) 8(0.71,2.5) 9(0.21,2.5) 10(-0.29,2.5) 11(-0.79,2.5) 12(-1.29,2.5) 13(-1.79,2.5) 14(-2.29,2.5) 15(-2.79,2.5) 16(-3.29,2.5) 17(-3.79,2.5) 18(-4.29,2.5) 19(-4.79,2.5)
  round 2 hole 1.3: Shd(-7.25,0) Shd(0,-3.3) Shd(7.25,0)
Top Overlay:
  circle w0.3: c4.9,3.3 r0.1
  lines w0.2: -8.7,-4.7 8.7,-4.7 8.7,3.8 -8.7,3.8 -8.7,-4.7
M3 Top Assy:
  lines w0.1: -4.905,1.525 -4.905,2.5 -4.79,2.5 -4.675,2.5 -4.675,1.525 ; -4.405,1.525 -4.405,2.5 -4.29,2.5 -4.175,2.5 -4.175,1.525 ; -3.905,1.525 -3.905,2.5 -3.79,2.5 -3.675,2.5 -3.675,1.525 ; -3.405,1.525 -3.405,2.5 -3.29,2.5 -3.175,2.5 -3.175,1.525 ; -2.905,1.525 -2.905,2.5 -2.79,2.5 -2.675,2.5 -2.675,1.525 ; -2.405,1.525 -2.405,2.5 -2.29,2.5 -2.175,2.5 -2.175,1.525 ; -1.905,1.525 -1.905,2.5 -1.79,2.5 -1.675,2.5 -1.675,1.525 ; -1.405,1.525 -1.405,2.5 -1.29,2.5 -1.175,2.5 -1.175,1.525 ; -0.905,1.525 -0.905,2.5 -0.79,2.5 -0.675,2.5 -0.675,1.525 ; -0.405,1.525 -0.405,2.5 -0.29,2.5 -0.175,2.5 -0.175,1.525 ; 0.095,1.525 0.095,2.5 0.21,2.5 0.325,2.5 0.325,1.525 ; 0.595,1.525 0.595,2.5 0.71,2.5 0.825,2.5 0.825,1.525 ; 1.095,1.525 1.095,2.5 1.21,2.5 1.325,2.5 1.325,1.525 ; 1.595,1.525 1.595,2.5 1.71,2.5 1.825,2.5 1.825,1.525 ; 2.095,1.525 2.095,2.5 2.21,2.5 2.325,2.5 2.325,1.525 ; 2.595,1.525 2.595,2.5 2.71,2.5 2.825,2.5 2.825,1.525 ; 3.095,1.525 3.095,2.5 3.21,2.5 3.325,2.5 3.325,1.525 ; 3.595,1.525 3.595,2.5 3.71,2.5 3.825,2.5 3.825,1.525 ; 4.095,1.525 4.095,2.5 4.21,2.5 4.325,2.5 4.325,1.525 ; -8.7,-4.7 8.7,-4.7 8.7,1.525 -8.7,1.525 -8.7,-4.7
M8 Top Brd Anno:
  lines w0.1: -0.6,0 0.6,0 ; 0,-0.6 0,0.6 ; -8.7,-4.7 8.7,-4.7 8.7,3.8 -8.7,3.8 -8.7,-4.7
3D body "476591000.stp": height 9.5, standoff -3, extent -8.75,-4.725 8.75,2.82
3D body: height 0.25, standoff 0, extent -1,4.112 -1,4.112

## I-PEX 20347-325E-12R [mm] "CONN RECPT PCB 25POS 14.4х4.2х1"
height 1
pads (25):
  rect 0.2x1.2 smd: 1(-4.8,0)
  oval 0.2x1.2 smd: 2(-4.4,0) 3(-4,0) 4(-3.6,0) 5(-3.2,0) 6(-2.8,0) 7(-2.4,0) 8(-2,0) 9(-1.6,0) 10(-1.2,0) 11(-0.8,0) 12(-0.4,0) 13(0,0) 14(0.4,0) 15(0.8,0) 16(1.2,0) 17(1.6,0) 18(2,0) 19(2.4,0) 20(2.8,0) 21(3.2,0) 22(3.6,0) 23(4,0) 24(4.4,0) 25(4.8,0)
Top Overlay:
  circle w0.3: c-5.55,0.35 r0.1
  lines w0.2: -7.575,-5.4 7.575,-5.4 7.575,1 -7.575,1 -7.575,-5.4
M3 Top Assy:
  drawing of 1604 lines, arcs and shapes, not listed
M8 Top Brd Anno:
  lines w0.1: -0.5,0 0.5,0 ; 0,-0.5 0,0.5 ; -7.725,-5.575 7.725,-5.575 7.725,1.175 -7.725,1.175 -7.725,-5.575
3D body "20347-025Exx2C RECE STEP R7 ALL.STEP": height 1, standoff -0.03, extent -7.41,-4.2 7.394,0
3D body: height 0.25, standoff 0, extent 1.6,4.112 1.6,4.112

## KMR231GLFS [mm]
pads (4):
  rrect50% 0.9x1 smd: 1(2.05,0.8) 2(2.05,-0.8) 3(-2.05,0.8) 4(-2.05,-0.8)
Top Overlay:
  lines w0.2: -2.525,-1.575 -2.525,-1.75 2.525,-1.75 2.525,-1.575 ; -2.525,1.575 -2.525,1.75 2.525,1.75 2.525,1.575
M3 Top Assy:
  lines w0.1: -1.75,-1.15 -2.25,-1.15 -2.25,-0.45 -1.75,-0.45 ; -1.75,0.45 -2.25,0.45 -2.25,1.15 -1.75,1.15 -1.75,0.8 ; 1.75,-1.15 2.25,-1.15 2.25,-0.45 1.75,-0.45 ; 1.75,0.45 2.25,0.45 2.25,1.15 1.75,1.15 ; -1.75,-1.5 -1.75,1.5 1.75,1.5 1.75,-1.5 -1.75,-1.5 ; -1,-0.675 -1,0 -1,0.675 1,0.675 1,0 1,-0.675 -1,-0.675
M8 Top Brd Anno:
  lines w0.1: -0.5,0 0.5,0 ; 0,-0.5 0,0.5 ; -2.3,-1.5 2.3,-1.5 2.3,1.5 -2.3,1.5 -2.3,-1.5
3D body "User Library-Switch-CK-KMR2.STEP": height 2.1, standoff 0, extent -2.3,-1.5 2.3,1.5

## M50-3120545 [mm]
height 3.6
pads (10):
  rect 0.8x2.4 smd: 1(2.54,-1.85)
  oval 0.8x2.4 smd: 2(2.54,1.85) 3(1.27,-1.85) 4(1.27,1.85) 5(0,-1.85) 6(0,1.85) 7(-1.27,-1.85) 8(-1.27,1.85) 9(-2.54,-1.85) 10(-2.54,1.85)
Top Overlay:
  circle w0.254: c3.555,-2.3 r0.127
  lines w0.2: -3.355,-1.6 -3.355,1.6 ; 3.355,-1.6 3.355,1.6
M3 Top Assy:
  lines w0.1: -2.74,-1.615 -2.74,-2.37 -2.34,-2.37 -2.34,-1.615 ; -2.74,1.615 -2.74,2.37 -2.34,2.37 -2.34,1.615 ; -1.47,-1.615 -1.47,-2.37 -1.07,-2.37 -1.07,-1.615 ; -1.47,1.615 -1.47,2.37 -1.07,2.37 -1.07,1.615 ; -0.2,-1.615 -0.2,-2.37 0.2,-2.37 0.2,-1.615 ; -0.2,1.615 -0.2,2.37 0.2,2.37 0.2,1.615 ; 1.06,-1.62 1.06,-2.375 1.46,-2.375 1.46,-1.62 ; 1.06,1.62 1.06,2.375 1.46,2.375 1.46,1.62 ; 2.34,-1.615 2.34,-2.37 2.74,-2.37 2.74,-1.615 ; 2.34,1.615 2.34,2.37 2.74,2.37 2.74,1.615 ; -3.155,-1.6 3.155,-1.6 3.155,1.6 -3.155,1.6 -3.155,-1.6 ; -2.77,-0.915 -2.27,-0.915 -2.27,-0.415 -2.77,-0.415 -2.77,-0.915 ; -2.77,0.425 -2.77,0.925 -2.27,0.925 -2.27,0.425 -2.77,0.425 ; -1.545,-0.915 -1.045,-0.915 -1.045,-0.415 -1.545,-0.415 -1.545,-0.915 ; -1.545,0.425 -1.545,0.925 -1.045,0.925 -1.045,0.425 -1.545,0.425 ; -0.22,-0.92 0.28,-0.92 0.28,-0.42 -0.22,-0.42 -0.22,-0.92 ; -0.22,0.42 -0.22,0.92 0.28,0.92 0.28,0.42 -0.22,0.42 ; 1.005,-0.92 1.505,-0.92 1.505,-0.42 1.005,-0.42 1.005,-0.92 ; 1.005,0.42 1.005,0.92 1.505,0.92 1.505,0.42 1.005,0.42 ; 2.325,-0.92 2.825,-0.92 2.825,-0.42 2.325,-0.42 2.325,-0.92 ; 2.325,0.42 2.325,0.92 2.825,0.92 2.825,0.42 2.325,0.42
M8 Top Brd Anno:
  lines w0.1: -0.5,0 0.5,0 ; 0,-0.5 0,0.5 ; -3.35,-2.25 3.35,-2.25 3.35,2.25 -3.35,2.25 -3.35,-2.25
3D body "m50-3120545_asm.stp": height 3.5, standoff -0.1, extent -3.35,-2.25 3.35,2.25